# Altium integrated library Opto Coupler.IntLib: 13 symbols
Pins are listed as number, name and electrical type; pins without a type are passive.

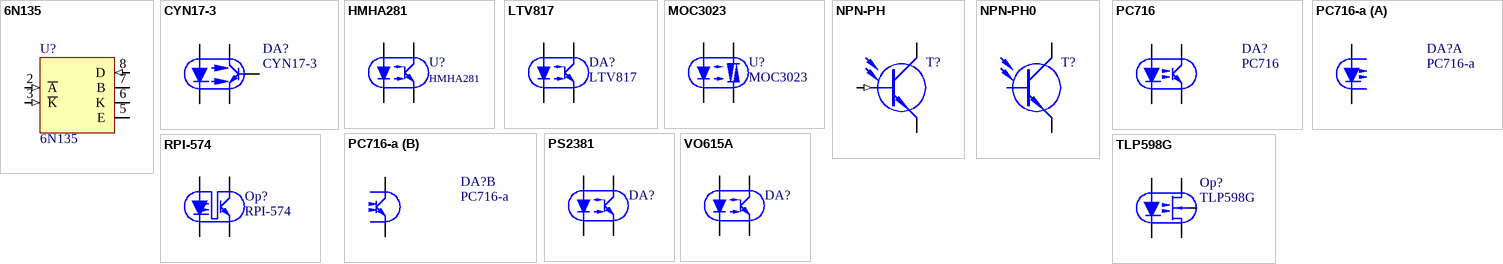
[diagram p0: symbols 6N135 to VO615A]

## 6N135
designator U?
footprint DIL8-300
pins: 2 ~{A} (in), 3 ~{K} (in), 5 E, 6 K (oc), 7 B, 8 D (in)

## CYN17-3
designator DA?
footprint DIL6-300
simulation model CNY17-3 (Model Description)
pins: 1 A, 2 C, 4 E, 5 C, 6 B

## HMHA281
designator U?
Price: 0.28
footprint DIL4-300
pins: 1 A, 2 C, 3 E, 4 C

## LTV817
designator DA?
Price: 0.28
footprint DIL4-300a
footprint DIL4-350a
footprint DIL4-400a
simulation model PC817 (Model Description)
pins: 1 A, 2 C, 3 E, 4 C
1 alternate drawing of the same symbol

## MOC3023
designator U?
Price: 0.82
footprint DIL6-300b
footprint DIL6-400b
footprint DIL6-350b
pins: 1 A, 2 C, 4 A1, 6 A2

## NPN-PH
designator T?
footprint TO92C
pins: 1 E (oe), 2 B (in), 3 C (oc)

## NPN-PH0
designator T?
footprint TO92C
pins: 1 E (oe), 3 C (oc)

## PC716
designator DA?
Price: 0.5
footprint DIL6-300b
footprint DIL6-400b
footprint DIL6-350b
pins: 1 A, 2 C, 3 hidden, 4 E, 5 C

## PC716-a
designator DA?
Price: 0.5
footprint DIL6-300b
footprint DIL6-400b
footprint DIL6-350b
part A pins: 1 A, 2 C, 3 hidden
part B pins: 4 E, 5 C, 6 hidden

## PS2381
designator DA?
Price: 0.28
footprint DIL4-300a
footprint DIL4-350a
footprint DIL4-400a
simulation model PS2381 (Model Description)
pins: 1 A, 2 C, 3 E, 4 C

## RPI-574
designator Op?
Price: 0.5
footprint RPI-574
pins: 1 A, 2 C, 3 C, 4 E

## TLP598G
designator Op?
Price: 3.026
footprint DIL6-300b
pins: 1 A, 2 C, 4 D2, 5 S, 6 D1

## VO615A
designator DA?
Price: 0.28
footprint DIL4-300a
footprint DIL4-350a
footprint DIL4-400a
simulation model VO615A (Model Description)
pins: 1 A, 2 C, 3 E, 4 C